# Altium footprint library TomvanRijn-PCB.PcbLib: 165 footprints (part 2 of 11)
Each footprint in its own frame and in the unit in brackets; x right, y up, seen from the top. Pads: shape width x height; smd on the part's side, far side on the other; paste and mask are expansions set on the pad; w line width, h text height; cw(c..) or ccw(c..) is an arc to the next point about the centre after c.
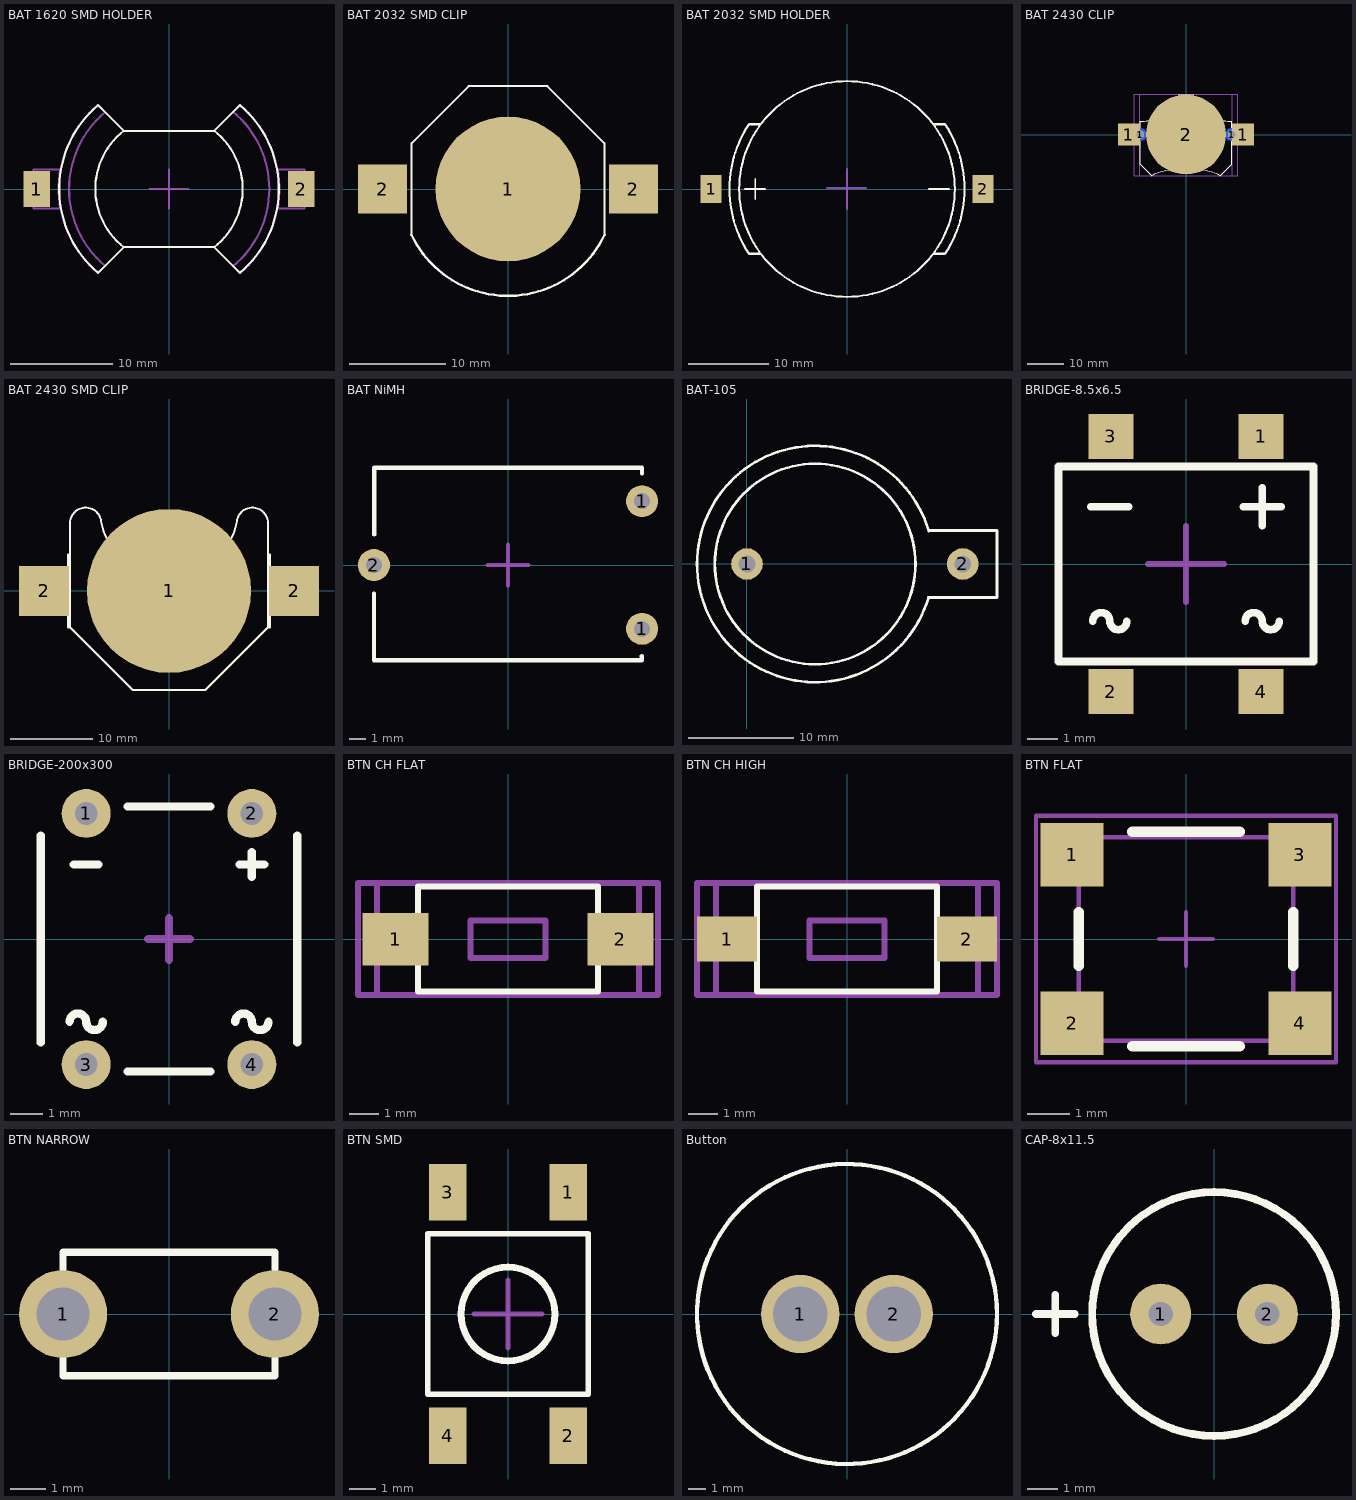
[diagram p1: the footprints below, top view; thin cyan lines are the x and y axes]

## BAT 1620 SMD HOLDER [mm] "Battery holder, CR1620, SMD"
height 5.3
pads (2):
  rect 2.6x3.5 smd: 1(-13,0) 2(13,0)
Top Overlay:
  lines w0.203: -6.973,-8.241 -6.971,-8.241 -4.445,-5.715 ; -6.973,-8.241 cw(c0,0) -6.973,8.241 -6.971,8.241 -4.445,5.715 ; 6.973,-8.241 ccw(c0,0) 6.973,8.241 ; 6.973,-8.241 6.971,-8.241 4.445,-5.715 ; 6.973,8.241 6.971,8.241 4.445,5.715 ; -4.445,-5.715 cw(c0,0) -4.445,5.715 ; -4.445,-5.715 4.445,-5.715 ; -4.445,5.715 4.445,5.715 ; 4.445,-5.715 ccw(c0,0) 4.445,5.715
Mechanical 1:
  lines w0.203: -10.668,-1.905 -13.335,-1.905 -13.335,1.905 -10.668,1.905 ; 10.668,-1.905 13.335,-1.905 13.335,1.905 10.668,1.905 ; -6.985,-8.255 cw(c0,0) -6.985,8.255 -6.288,7.558 -6.288,7.545 ccw(c0,0) -6.288,-7.545 -6.985,-8.242 -6.985,-8.255 ; 6.313,-7.583 6.985,-8.255 ccw(c0,0) 6.985,8.255 6.313,7.583 6.313,7.576 cw(c0,0) 6.313,-7.576 6.313,-7.583
  lines w0.254: -10.668,-1.905 cw(c0,0) -10.668,1.905 ; 10.668,-1.905 ccw(c0,0) 10.668,1.905
Mechanical 15:
  lines w0.203: -1.905,0 1.905,0 ; 0,-1.905 0,1.905
3D body: height 5.3, standoff 0, extent -10.813,-8.254 -6.288,8.254
3D body: height 5.3, standoff 0, extent 6.313,-8.256 10.814,8.256
3D body: height 0.5, standoff 0, extent -13.336,-1.906 -10.667,1.906
3D body: height 0.5, standoff 0, extent 10.667,-1.906 13.336,1.906
3D body: height 1, standoff 0, extent -10.796,-8.241 10.796,8.241

## BAT 2032 SMD CLIP [mm] "Battery holder, CR2032, SMD"
height 4
pads (3):
  round 15 smd paste-2000: 1(0,0)
  rect 5.08x5.08 smd: 2(-13,0) 2(13,0)
Top Overlay:
  lines w0.203: -10,-4.75 -10,4.75 -9.982,4.75 -4.082,10.65 -3.8,10.65 3.8,10.65 4.082,10.65 9.982,4.75 10,4.75 10,-4.75
  lines w0.254: -10,-4.75 ccw(c0,0) 10,-4.75
Mechanical 15:
  lines w0.203: -1.016,0 0,0 ; 0,-1.016 0,1.143 0,0 ; 1.016,0 0,0
3D body "SMD-BAT.step": height 3.96, standoff 0, extent -15.367,-9.779 15.367,10.274

## BAT 2032 SMD HOLDER [mm] "Battery holder, CR2032, SMD"
height 4.9
pads (2):
  rect 2.6x3.5 smd: 1(-16.9,0) 2(16.9,0)
Top Overlay:
  circle w0.254: c0,0 r13.4
  lines w0.203: -12.7,0 -10.16,0 ; -11.43,-1.27 -11.43,1.27 ; -10.766,-8.05 -10.717,-8.001 ; 10.16,0 12.7,0 ; 10.668,8.128 10.746,8.05 ; 10.795,-8.001 10.844,-8.05
  lines w0.254: -10.844,8.05 -12.192,8.05 ccw(c0,0) -12.192,-8.05 -10.766,-8.05 ; 10.746,8.05 12.192,8.05 cw(c0,0) 12.192,-8.05 10.844,-8.05
Mechanical 15:
  lines w0.203: -2.54,0.127 2.413,0.127 ; 0,-2.54 0,2.54
3D body "CR2032.step": height 5.3, standoff 0, extent -16,-10 16,10

## BAT 2430 CLIP [mil] "Battery clip, through hole, 25.75 mm pitch, CR 2430"
height 118.11
pads (7):
  rect 240x240 smd: 1(-625,0) 1(625,0)
  round 85 hole 78.74: 1(-501.97,0) 1(501.97,0)
  round 140 smd far side paste-1000: 1(-501.97,0) 1(501.97,0)
  round 875 smd paste-1500: 2(0,0)
Top Overlay:
  lines w10: -501.97,-323.03 -375,-450 cw(c0.29,-1305.66) 375.58,-450 375.58,-449.42 500,-325 501.97,-323.03 501.97,-307.09 501.97,143.69 cw(c500,595) 78.74,433.07 -78.74,433.07 cw(c-500,595) -501.97,143.69 -501.97,-307.09 -501.97,-323.03
Mechanical 13:
  lines w3.94: -505,-450 -505,440 505,440 505,-450 -505,-450
  lines w10: -500,-145 -500,135 ; 500,-140 500,135
  text "for battery insertion." at -501.97,-710 h78.74
  text "Provide mechanical clearance" at -500,-640 h78.74
  text "Important:" at -501.97,-570 h78.74
Mechanical 15:
  lines w3.94: -25,0 25,0 ; 0,-25 0,25 ; -565,-450 565,-450 565,440 -120,440 -565,440 -565,-450
3D body: height 0, standoff -118.11, extent 472.68,-29.46 531.5,29.48
3D body: height 0, standoff -118.11, extent -531.26,-29.46 -472.44,29.48
3D body: height 122.05, standoff 0, extent 501.98,-140.02 505,143.32
3D body: height 122.05, standoff 0, extent -505.01,-140.02 -501.97,143.37
3D body: height 122.05, standoff 118.11, extent -501.99,-450.02 501.99,433.09

## BAT 2430 SMD CLIP [mil] "Battery holder, CR2430, SMD"
height 196.85
pads (3):
  round 787.4 smd paste-78740.2: 1(0,0)
  rect 240x240 smd: 2(-600,0) 2(600,0)
Top Overlay:
  lines w10: -475,-100 -700,-100 -700,100 -475,100 ; -475,175 -485,175 -485,-175 -475,-175 ; 475,-100 700,-100 700,100 475,100 ; 475,175 485,175 485,-175 475,-175 ; -475,-175 -475,325 cw(c-400,325) -325,325 ccw(c0,400) 325,325 cw(c400,325) 475,325 475,-175 ; -475,-175 -175,-475 175,-475 475,-175
Mechanical 15:
  lines w8: -50,0 55,0 ; 0,-55 0,50
3D body: height 100, standoff 95, extent -475.02,-475.02 475.02,400.02
3D body: height 5, standoff 0, extent -699.98,-99.98 -475.02,99.98
3D body: height 5, standoff 0, extent 475.02,-99.98 699.98,99.98
3D body: height 100, standoff 0, extent -484.98,-99.98 -475.02,99.98
3D body: height 100, standoff 0, extent 475.02,-99.98 484.98,99.98
3D body: height 100, standoff 0, extent -484.98,-174.98 -475.02,-100.02
3D body: height 100, standoff 0, extent -484.98,100.02 -475.02,174.98
3D body: height 100, standoff 0, extent 475.02,-174.98 484.98,-100.02
3D body: height 100, standoff 0, extent 475.02,100.02 484.98,174.98

## BAT NiMH [mm] "Battery, rechargeable NiMH, 3 cells, 3.6V"
height 16
pads (3):
  round 2 hole 1: 1(8.4,-4) 1(8.4,4) 2(-8.4,0)
Top Overlay:
  lines w0.254: -8.4,-1.778 -8.4,-5.969 8.382,-5.969 8.382,-5.715 ; -8.382,1.905 -8.382,6.096 8.4,6.096 8.4,5.733
Mechanical 15:
  lines w0.254: -1.27,0 1.27,0 ; 0,-1.27 0,1.27
3D body: height 10.99, standoff 1.01, extent 5.08,-4.98 8.08,4.98
3D body: height 10.99, standoff 1.01, extent 0,-4.98 3,4.98
3D body: height 10.99, standoff 1.01, extent -5.207,-4.98 -2.207,4.98
3D body: height 11.99, standoff 0.01, extent 2.715,-5.976 5.715,5.976
3D body: height 11.99, standoff 0.01, extent -2.619,-5.976 0.381,5.976
3D body: height 11.99, standoff 0.01, extent -7.9,-5.933 -4.9,6.02
3D body: height 7, standoff -3, extent 7.904,-4.499 8.9,-3.501
3D body: height 7, standoff -3, extent 7.904,3.501 8.9,4.499
3D body: height 7, standoff -3, extent -8.896,-0.499 -7.9,0.499
3D body: height 10.99, standoff 1.01, extent -8.4,-4.96 -7.9,5
3D body: height 10.99, standoff 1.01, extent 8.009,-4.98 8.509,4.98

## BAT-105 [mm] "Battery holder, 2 leads"
height 50
pads (2):
  round 3 hole 1.6: 1(0,0) 2(20.5,0)
Top Overlay:
  circle w0.254: c6.477,0 r9.525
  lines w0.254: 17.247,-3.168 cw(c6.477,0) 17.256,3.134 ; 17.272,-3.175 23.749,-3.175 23.749,3.175 17.298,3.175
3D body "BAT.step": height 7.15, standoff -3.4, extent -4.898,-11.375 23.802,11.375

## BRIDGE-8.5x6.5 [mm] "Bridge rectifier, SMD; body 8.5 x 6.5 mm; leads 5 mm pitch"
height 3.3
pads (4):
  rect 1.5x1.5 smd: 1(2.5,4.25) 2(-2.5,-4.25) 3(-2.5,4.25) 4(2.5,-4.25)
Top Overlay:
  lines w0.254: -3.175,1.905 -1.905,1.905 ; -3.108,-1.905 cw(c-2.824,-1.905) -2.54,-1.905 ccw(c-2.256,-1.905) -1.972,-1.905 ; 1.905,1.905 3.175,1.905 ; 1.972,-1.905 cw(c2.256,-1.905) 2.54,-1.905 ccw(c2.824,-1.905) 3.108,-1.905 ; 2.54,1.27 2.54,2.54 ; -4.25,-3.25 4.25,-3.25 4.25,3.25 -4.25,3.25 -4.25,-3.25
Mechanical 15:
  lines w0.203: -1.27,0 1.27,0 ; 0,-1.27 0,1.27
3D body "SDIP.step": height 3.63, standoff 0, extent -4.258,-5.004 4.242,4.996

## BRIDGE-200x300 [mm] "Bridge rectifier, 200 mil pitch, 300 mil row spacing"
height 8
pads (4):
  round 1.5 hole 0.7: 1(-2.54,3.85) 2(2.54,3.85) 3(-2.54,-3.85) 4(2.54,-3.85)
Top Overlay:
  lines w0.254: -3.937,-3.175 -3.937,3.175 ; -3.048,-2.54 cw(c-2.794,-2.54) -2.54,-2.54 ccw(c-2.286,-2.54) -2.032,-2.54 ; -2.921,2.286 -2.159,2.286 ; -1.27,-4.064 1.27,-4.064 ; -1.27,4.064 1.27,4.064 ; 2.032,-2.54 cw(c2.286,-2.54) 2.54,-2.54 ccw(c2.794,-2.54) 3.048,-2.54 ; 2.159,2.286 2.921,2.286 ; 2.54,1.905 2.54,2.667 ; 3.937,-3.175 3.937,3.175
Mechanical 15:
  lines w0.254: -0.635,0 0.635,0 ; 0,-0.635 0,0.635
3D body "DIP-4.step": height 3.8, standoff -2.7, extent -3.85,-3.993 3.85,3.99

## BTN CH FLAT [mil] "Button, SMD, pitch 300 mil"
height 100
pads (2):
  rect 88x70 smd: 1(-150,0) 2(150,0)
Top Overlay:
  lines w8: -120,-70 120,-70 120,70 -120,70 -120,-70
Mechanical 13:
  lines w8: -175,-75 175,-75 175,75 -175,75 -175,-75 ; -175,-25 -175,25 -120,25 -120,-25 -175,-25 ; -50,-25 50,-25 50,25 -50,25 -50,-25 ; 120,-25 175,-25 175,25 120,25 120,-25
Mechanical 15:
  lines w8: -200,-75 200,-75 200,75 -200,75 -200,-75
3D body: height 30, standoff 0, extent -174.98,-24.98 -120.02,24.98
3D body: height 100, standoff 80, extent -49.98,-24.98 49.98,24.98
3D body: height 30, standoff 0, extent 120.02,-24.98 174.98,24.98
3D body: height 80, standoff 0, extent -119.98,-69.98 119.98,69.98

## BTN CH HIGH [mil] "Button, SMD, 320 mil pitch"
height 160
pads (2):
  rect 80x60 smd: 1(-160,0) 2(160,0)
Top Overlay:
  lines w8: -120,-70 120,-70 120,70 -120,70 -120,-70
Mechanical 13:
  lines w8: -175,-75 175,-75 175,75 -175,75 -175,-75 ; -175,-15 -175,15 -120,15 -120,-15 -175,-15 ; -50,-25 50,-25 50,25 -50,25 -50,-25 ; 120,-15 175,-15 175,15 120,15 120,-15
Mechanical 15:
  lines w8: -200,-75 200,-75 200,75 -200,75 -200,-75
3D body: height 130, standoff 0, extent -119.98,-69.98 119.98,69.98
3D body: height 140, standoff 130, extent -119.98,-69.98 119.98,69.98
3D body: height 180, standoff 130, extent -49.98,-24.98 49.98,24.98
3D body: height 20, standoff 0, extent -174.98,-14.98 -120.02,14.98
3D body: height 20, standoff 0, extent 120.02,-14.98 174.98,14.98

## BTN FLAT [mm] "Pushbutton, NO, flat style"
height 0.635
pads (4):
  rect 1.5x1.5 smd: 1(-2.7,2) 2(-2.7,-2) 3(2.7,2) 4(2.7,-2)
Top Overlay:
  lines w0.254: -2.54,-0.635 -2.54,0.635 ; -1.27,-2.54 1.27,-2.54 ; -1.27,2.54 1.27,2.54 ; 2.54,-0.635 2.54,0.635
Mechanical 13:
  lines w0.1: -2.54,-2.413 -2.54,2.413 2.54,2.413 2.54,-2.413 -2.54,-2.413
Mechanical 15:
  lines w0.1: -0.635,0 0.635,0 ; 0,-0.635 0,0.635 ; -3.556,-2.921 -3.556,2.921 3.556,2.921 3.556,-2.921 -3.556,-2.921
3D body "FLAT.step": height 1.13, standoff -0.37, extent -2.497,-2.462 2.497,2.438

## BTN NARROW [mm] "Button, tactile, through hole, 6 mm pitch"
height 5
pads (2):
  round 2.5 hole 1.5: 1(-3,0) 2(3,0)
Top Overlay:
  lines w0.203: -3,-1.27 -3,-1.75 3,-1.75 3,-1.27 ; -3,1.27 -3,1.75 3,1.75 3,1.27
3D body: height 5, standoff 2.5, extent -1.27,-0.635 1.27,0.635
3D body: height 3, standoff 0, extent -3.102,-1.852 3.102,1.852
3D body: height 3.1, standoff 3, extent -3.102,-1.852 3.102,1.852
3D body: height 1, standoff -2, extent -3.198,-0.199 -2.8,0.2
3D body: height 1, standoff -2, extent 2.802,-0.2 3.2,0.2

## BTN SMD [mm] "Pushbutton, NO, SMD"
height 3.5
pads (4):
  rect 1.4x2.1 smd: 1(2.25,4.55) 2(2.25,-4.55) 3(-2.25,4.55) 4(-2.25,-4.55)
Top Overlay:
  circle w0.254: c0,0 r1.75
  lines w0.203: -3,-3 3,-3 3,3 -3,3 -3,-3
Mechanical 15:
  lines w0.203: -1.27,0 1.27,0 ; 0,-1.27 0,1.27
3D body "BTN.step": height 4.44, standoff -0.1, extent -3,-5 3,5

## Button [mm]
pads (2):
  round 4.572 hole 3.2: 1(-2.73,0) 2(2.73,0)
Top Overlay:
  circle w0.254: c0,0 r8.763
3D body "User Library-PUSHBUTTON-2.STEP": height 17.11, standoff -3.46, extent -8.763,-8.763 8.763,8.763

## CAP-8x11.5 [mm] "Capacitor, electrolytic, body 8x 11.5 mm; 3.5 mm pitch"
height 11.5
pads (2):
  round 2 hole 0.8: 1(-1.75,0) 2(1.75,0)
Top Overlay:
  circle w0.254: c0,0 r4
  lines w0.254: -5.842,0 -4.572,0 ; -5.207,-0.635 -5.207,0.635
3D body "CAP-8x11.5.step": height 11.49, standoff -19, extent -4,-4.064 4,3.936